# Altium footprint library hphonglib.PcbLib: 703 footprints (part 41 of 44)
Each footprint in its own frame and in the unit in brackets; x right, y up, seen from the top. Pads: shape width x height; smd on the part's side, far side on the other; paste and mask are expansions set on the pad; w line width, h text height; cw(c..) or ccw(c..) is an arc to the next point about the centre after c.
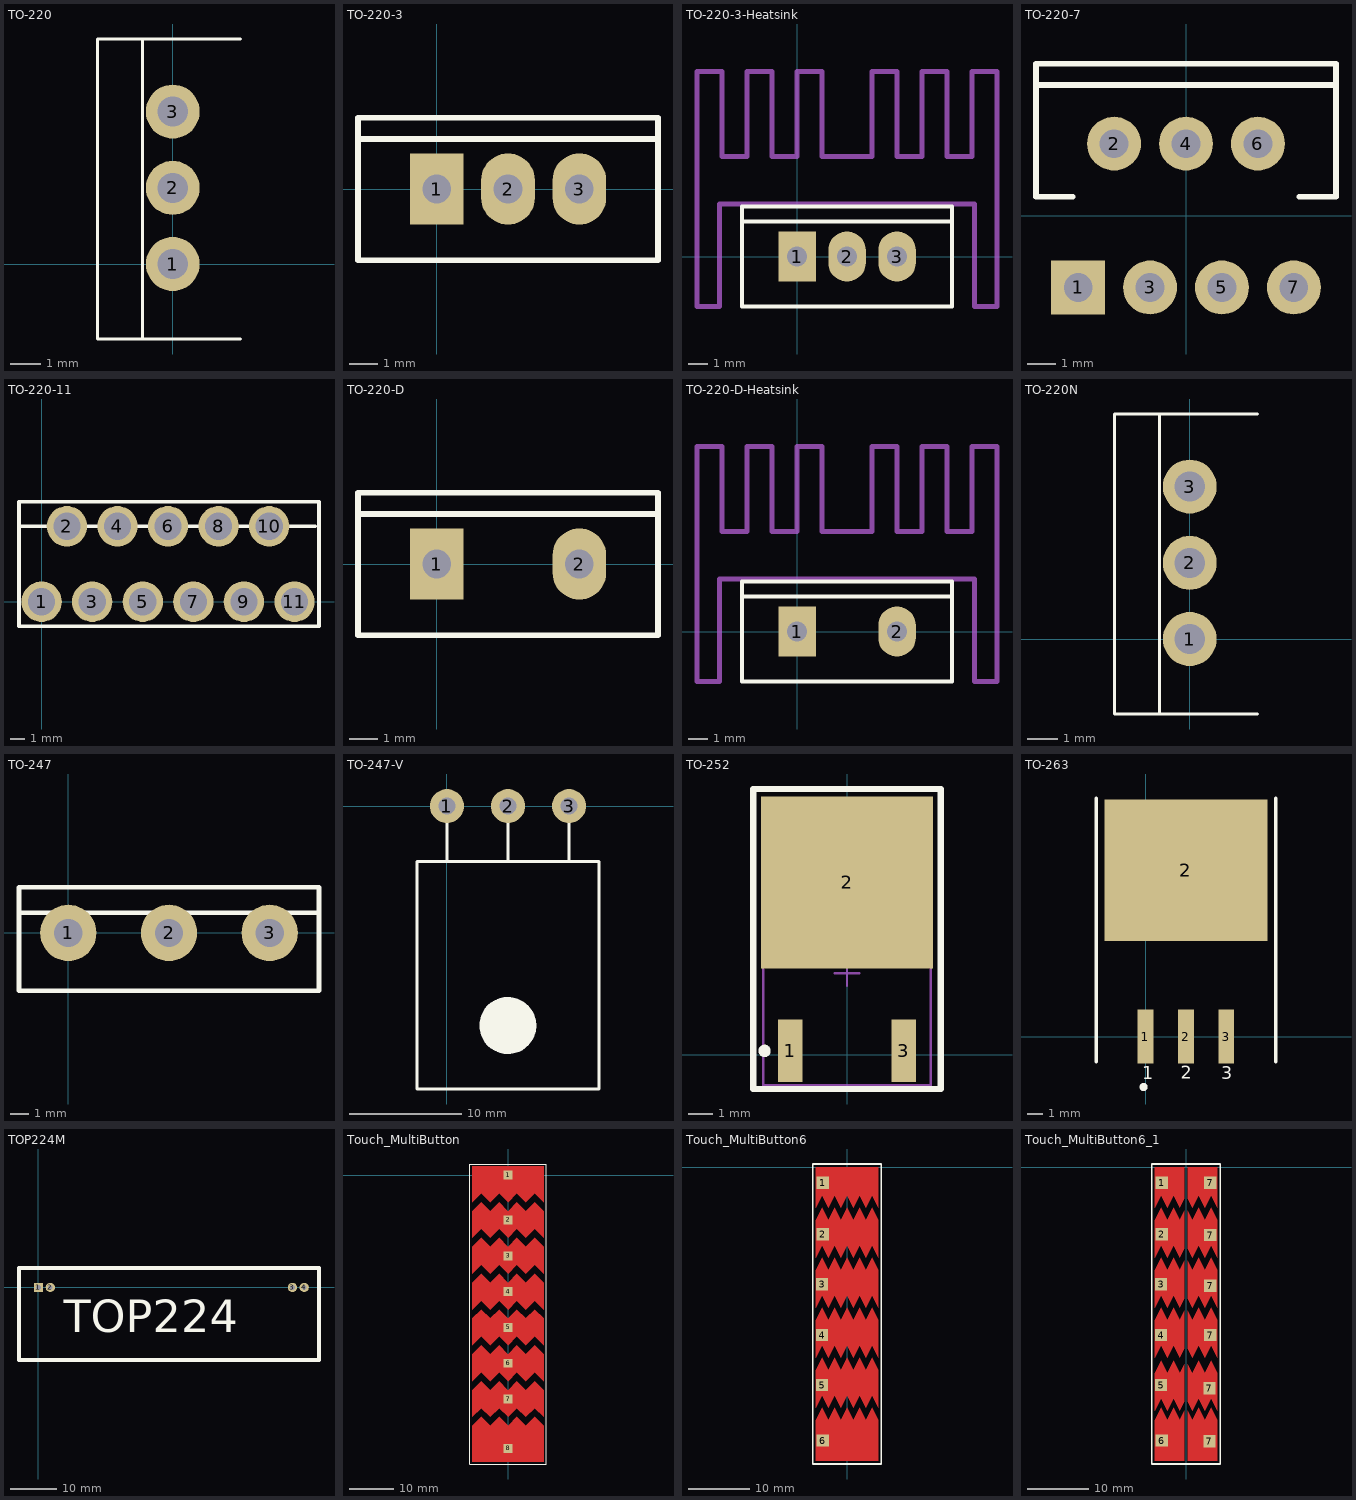
[diagram p40: the footprints below, top view; thin cyan lines are the x and y axes]

## TO-220 [mm]
pads (3):
  round 1.8 hole 1: 1(0,0) 2(0,2.54) 3(0,5.08)
Top Overlay:
  lines w0.1: -1,-2.5 -1,7.5 ; 2.25,-2.5 -2.5,-2.5 -2.5,7.5 2.25,7.5
Bottom Overlay:
  lines w0.1: -1.725,-1.4 -1.725,6.5 1.625,6.5 1.625,-1.4 -1.725,-1.4
Mechanical 13:
  text ".Designator" at 0.635,0.457 h2.03
3D body: height 16.7, standoff 13, extent -2.4,-2.45 -1.1,7.45
3D body: height 13, standoff 4, extent -2.4,-2.45 2.1,7.45
3D body: height 4, standoff 1, extent -0.3,-0.65 0.2,0.65
3D body: height 1, standoff -9, extent -0.3,-0.4 0.2,0.4
3D body: height 18.4, standoff 16.7, extent -2.4,-1.85 -1.1,6.85
3D body: height 19.7, standoff 18.4, extent -2.4,-2.45 -1.1,7.45
3D body: height 1, standoff -9, extent -0.3,2.14 0.2,2.94
3D body: height 1, standoff -9, extent -0.3,4.68 0.2,5.48
3D body: height 4, standoff 1, extent -0.3,1.89 0.2,3.19
3D body: height 4, standoff 1, extent -0.3,4.43 0.2,5.73

## TO-220-3 [mil] "TO-220; 3 Leads; Solder Pad 35mil"
pads (3):
  rect 75x100 hole 40: 1(0,0)
  oval 75x100 hole 40: 2(100,0) 3(200,0)
Top Overlay:
  lines w7.87: -110,70 310,70 ; -110,-100 310,-100 310,100 -110,100 -110,-100
3D body: height 760.24, standoff -372.83, extent -94.88,-83.16 294.88,94

## TO-220-3-Heatsink [mil] "TO-220; Heatsink; 3 Leads; Solder Pad 35mil"
pads (3):
  rect 75x100 hole 40: 1(0,0)
  oval 75x100 hole 40: 2(100,0) 3(200,0)
Top Overlay:
  lines w7.87: -110,70 310,70 ; -110,-100 -110,100 310,100 310,-100 -110,-100
Mechanical 1:
  lines w10: -200,-100 -200,370 ; 400,-100 400,370
Mechanical 13:
  lines w10: -200,-100 -155,-100 -155,105 355,105 355,-100 400,-100 ; -200,370 -150,370 -150,200 -100,200 -100,370 -50,370 -50,200 0,200 0,370 50,370 50,200 150,200 150,370 200,370 200,200 250,200 250,370 300,370 300,200 350,200 350,370 400,370
3D body: height 985.25, standoff -148.61, extent -191,-76.63 390.94,348.62
3D body: height 810.24, standoff -322.83, extent -94.88,-83.16 294.88,94

## TO-220-7 [mil] "TO-220; 7 Bent Staggered Leads; Solder Pad 35mil"
height 830.71
pads (7):
  rect 75x75 hole 40: 1(-150,-100)
  round 75 hole 40: 2(-100,100) 3(-50,-100) 4(0,100) 5(50,-100) 6(100,100) 7(150,-100)
Top Overlay:
  lines w7.87: -208.66,181.73 208.66,181.73 ; -157.48,26.38 -208.66,26.38 -208.66,211.42 208.66,211.42 208.66,26.38 157.48,26.38
3D body: height 766.77, standoff -67.87, extent -200.57,-110.03 201,212.02

## TO-220-11 [mil] "TO-220; 11 Bent Staggered Leads; Solder Pad 35mil"
pads (11):
  round 107 hole 72: 1(0,0) 2(67,200) 3(134,0) 4(201,200) 5(268,0) 6(335,200) 7(402,0) 8(469,200) 9(536,0) 10(603,200) 11(670,0)
Top Overlay:
  lines w10: -55,200 725,200 ; -60,-65 -60,265 735,265 735,-65 -60,-65

## TO-220-D [mil] "TO-220; Diode; 2 Leads; Solder Pad 35mil"
pads (2):
  rect 75x100 hole 40: 1(0,0)
  oval 75x100 hole 40: 2(200,0)
Top Overlay:
  lines w7.87: -110,70 310,70 ; -110,-100 310,-100 310,100 -110,100 -110,-100
3D body: height 740.24, standoff -392.83, extent -94.88,-83.16 294.89,94

## TO-220-D-Heatsink [mil] "TO-220; Diode; Heatsink; 2 Leads; Solder Pad 35mil"
pads (2):
  rect 75x100 hole 40: 1(0,0)
  oval 75x100 hole 40: 2(200,0)
Top Overlay:
  lines w7.87: -110,70 310,70 ; -110,-100 310,-100 310,100 -110,100 -110,-100
Mechanical 1:
  lines w10: -200,-100 -200,370 ; 400,-100 400,370
Mechanical 13:
  lines w10: -200,-100 -155,-100 -155,105 355,105 355,-100 400,-100 ; -200,370 -150,370 -150,200 -100,200 -100,370 -50,370 -50,200 0,200 0,370 50,370 50,200 150,200 150,370 200,370 200,200 250,200 250,370 300,370 300,200 350,200 350,370 400,370
3D body: height 810.24, standoff -322.83, extent -94.88,-83.16 294.88,94
3D body: height 985.25, standoff -148.61, extent -191,-76.63 390.94,348.62

## TO-220N [mm]
pads (3):
  round 1.8 hole 1: 1(0,0) 2(0,2.54) 3(0,5.08)
Top Overlay:
  lines w0.1: -1,-2.5 -1,7.5 ; 2.25,-2.5 -2.5,-2.5 -2.5,7.5 2.25,7.5
Bottom Overlay:
  lines w0.1: -1.725,-1.4 1.625,-1.4 1.625,6.5 -1.725,6.5 -1.725,-1.4
3D body: height 18, standoff -10.4, extent -2.62,-2.667 1.88,7.733

## TO-247 [mil] "TO-247; 3 Leads; Solder Pad 60mil"
pads (3):
  round 120 hole 60: 1(0,0) 2(214.5,0) 3(429,0)
Top Overlay:
  lines w10: -105,43 534,43 ; -105,-123 534,-123 534,97 -105,97 -105,-123
3D body: height 1037.4, standoff -320.87, extent -92.5,-117.33 521.67,91.33

## TO-247-V [mil] "TO-247; Vertical; 3 Leads; Solder Pad 60mil"
pads (3):
  round 120 hole 60: 1(0,0) 2(214.5,0) 3(429,0)
Top Overlay:
  circle w100: c214,-771 r50
  lines w10: 0,-194 0,0 ; 214.5,-195 214.5,0 ; 429,-195 429,0 ; -105,-994 534,-994 534,-195 -105,-195 -105,-994
3D body: height 228.74, standoff -239.76, extent -90.62,-988 519.62,12

## TO-252 [mm]
pads (3):
  rect 1x2.54 smd: 1(-2.3,0.152) 3(2.3,0.152)
  rect 7x7 smd: 2(0,7)
Top Overlay:
  circle w0.25: c-3.35,0.152 r0.125
  lines w0.254: -3.81,-1.397 3.81,-1.397 3.81,10.795 0.508,10.795 -3.81,10.795 -3.81,-1.397
Mechanical 13:
  text ".Designator" at 2.692,3.912 h2.03
Mechanical 15:
  lines w0.1: -0.5,3.302 0.5,3.302 ; 0,2.802 0,3.802 ; -3.4,-1.248 -3.4,7.852 3.4,7.852 3.4,-1.248 -3.4,-1.248

## TO-263 [mm]
pads (4):
  rect 1x3.4 smd: 1(-0.006,0.009) 2(2.534,0.009) 3(5.074,0.009)
  rect 10.25x8.9 smd: 2(2.534,10.459)
Top Overlay:
  circle w0.25: c-0.126,-3.166 r0.125
  lines w0.2: -3.106,-1.591 -3.106,15.009 ; 8.194,-1.591 8.194,15.009
  text "2" at 2.213,-2.653 h0.8
  text "3" at 4.774,-2.691 h0.8
  text "1" at -0.201,-2.666 h0.8
Mechanical 13:
  text ".Designator" at -1.422,4.521 h2.03
3D body: height 2.9, standoff 0, extent 4.694,0.75 5.456,1.25
3D body: height 2.9, standoff 0, extent -0.381,0.76 0.381,1.26
3D body: height 0.5, standoff 0, extent 4.694,-1.153 5.456,1
3D body: height 2.9, standoff 2.4, extent 4.475,1 5.675,3.8
3D body: height 2.9, standoff 2.4, extent 1.94,2.375 3.14,3.81
3D body: height 2.9, standoff 2.4, extent -0.6,1.01 0.6,3.81
3D body: height 1.3, standoff 0, extent -2.46,13.01 7.54,14.21
3D body: height 4.5, standoff 0, extent -2.46,3.81 7.54,13.01
3D body: height 0.5, standoff 0, extent -0.381,-1.143 0.381,1.01

## TOP224M [mm] "module TOP224"
pads (4):
  rect 2x2 hole 1: 1(0,0)
  round 2 hole 1: 2(2.54,0) 3(54.61,0) 4(57.15,0)
Top Overlay:
  lines w0.8: -4.191,-15.621 -4.191,4.191 60.325,4.191 60.325,-15.621 -4.191,-15.621
  text "TOP224" at 5.461,-9.652 h7

## Touch_MultiButton [mm]
pads (8):
  rect 2x2 smd paste+0 mask+0: 1(0,0) 2(0,-10) 3(0,-18) 4(0,-26) 5(0,-34) 6(0,-42) 7(0,-50) 8(0,-61)
Top Layer:
  region: 8,-40 6,-38 4,-40 2,-38 0,-40 -2,-38 -4,-40 -6,-38 -8,-40 -8,-46 -6,-44 -4,-46 -2,-44 0,-46 2,-44 4,-46 6,-44 8,-46
  region: 8,-48 6,-46 4,-48 2,-46 0,-48 -2,-46 -4,-48 -6,-46 -8,-48 -8,-54 -6,-52 -4,-54 -2,-52 0,-54 2,-52 4,-54 6,-52 8,-54
  region: 8,-32 6,-30 4,-32 2,-30 0,-32 -2,-30 -4,-32 -6,-30 -8,-32 -8,-38 -6,-36 -4,-38 -2,-36 0,-38 2,-36 4,-38 6,-36 8,-38
  region: 8,-24 6,-22 4,-24 2,-22 0,-24 -2,-22 -4,-24 -6,-22 -8,-24 -8,-30 -6,-28 -4,-30 -2,-28 0,-30 2,-28 4,-30 6,-28 8,-30
  region: -8,-64 -8,-56 -7,-55 -6,-54 -4,-56 -2,-54 0,-56 2,-54 4,-56 6,-54 7,-55 8,-56 8,-64
  region: 8,-16 6,-14 4,-16 2,-14 0,-16 -2,-14 -4,-16 -6,-14 -8,-16 -8,-22 -6,-20 -4,-22 -2,-20 0,-22 2,-20 4,-22 6,-20 8,-22
  region: 8,-8 6,-6 4,-8 2,-6 0,-8 -2,-6 -4,-8 -6,-6 -8,-8 -8,-14 -6,-12 -4,-14 -2,-12 0,-14 2,-12 4,-14 6,-12 8,-14
  region: 8,2 8,-6 7,-5 6,-4 4,-6 3,-5 2,-4 0,-6 -2,-4 -3,-5 -4,-6 -6,-4 -7,-5 -8,-6 -8,2
Top Overlay:
  lines w0.254: -8.5,-64.5 8.5,-64.5 8.5,2.5 -8.5,2.5 -8.5,-64.5

## Touch_MultiButton6 [mm]
pads (6):
  rect 2x2 smd paste+0 mask+0: 1(-3.937,-2.54) 2(-3.937,-10.922) 3(-4.064,-19.05) 4(-4.064,-27.305) 5(-4.064,-35.433) 6(-3.937,-44.45)
Top Layer:
  region: 5.08,0 5.08,-6.604 4.064,-4.572 3.048,-6.604 2.032,-4.572 1.016,-6.604 0,-4.572 -1.016,-6.604 -2.032,-4.572 -3.048,-6.604 -4.064,-4.572 -5.08,-6.604 -5.08,0
  region: 5.08,-8.636 4.064,-6.604 3.048,-8.636 2.032,-6.604 1.016,-8.636 0,-6.604 -1.016,-8.636 -2.032,-6.604 -3.048,-8.636 -4.064,-6.604 -5.08,-8.636 -5.08,-14.732 -4.064,-12.7 -3.048,-14.732 -2.032,-12.7 -1.016,-14.732 0,-12.7 1.016,-14.732 2.032,-12.7 3.048,-14.732 4.064,-12.7 5.08,-14.732
  region: 5.08,-16.764 4.064,-14.732 3.048,-16.764 2.032,-14.732 1.016,-16.764 0,-14.732 -1.016,-16.764 -2.032,-14.732 -3.048,-16.764 -4.064,-14.732 -5.08,-16.764 -5.08,-22.86 -4.064,-20.828 -3.048,-22.86 -2.032,-20.828 -1.016,-22.86 0,-20.828 1.016,-22.86 2.032,-20.828 3.048,-22.86 4.064,-20.828 5.08,-22.86
  region: 5.08,-24.892 4.064,-22.86 3.048,-24.892 2.032,-22.86 1.016,-24.892 0,-22.86 -1.016,-24.892 -2.032,-22.86 -3.048,-24.892 -4.064,-22.86 -5.08,-24.892 -5.08,-30.988 -4.064,-28.956 -3.048,-30.988 -2.032,-28.956 -1.016,-30.988 0,-28.956 1.016,-30.988 2.032,-28.956 3.048,-30.988 4.064,-28.956 5.08,-30.988
  region: 5.08,-33.02 4.064,-30.988 3.048,-33.02 2.032,-30.988 1.016,-33.02 0,-30.988 -1.016,-33.02 -2.032,-30.988 -3.048,-33.02 -4.064,-30.988 -5.08,-33.02 -5.08,-39.116 -4.064,-37.084 -3.048,-39.116 -2.032,-37.084 -1.016,-39.116 0,-37.084 1.016,-39.116 2.032,-37.084 3.048,-39.116 4.064,-37.084 5.08,-39.116
  region: -5.08,-47.752 -5.08,-41.148 -4.064,-39.116 -3.048,-41.148 -2.032,-39.116 -1.016,-41.148 0,-39.116 1.016,-41.148 2.032,-39.116 3.048,-41.148 4.064,-39.116 5.08,-41.148 5.08,-47.752
Top Overlay:
  lines w0.254: -5.588,-48.26 5.588,-48.26 5.588,0.508 -5.588,0.508 -5.588,-48.26

## Touch_MultiButton6_1 [mm]
pads (12):
  rect 2x2 smd paste+0 mask+0: 1(-3.937,-2.54) 2(-3.937,-10.922) 3(-4.064,-19.05) 4(-4.064,-27.305) 5(-4.064,-35.433) 6(-3.937,-44.45) 7(3.81,-44.577) 7(3.81,-35.941) 7(3.937,-27.305) 7(3.937,-19.304) 7(3.937,-11.049) 7(3.937,-2.54)
Top Layer:
  region: 0.254,-47.752 0.254,-39.624 1.016,-41.148 2.032,-39.116 3.048,-41.148 4.064,-39.116 5.08,-41.148 5.08,-47.752
  region: -0.254,-32.004 -1.016,-33.528 -2.032,-31.496 -3.048,-33.528 -4.064,-31.496 -5.08,-33.528 -5.08,-39.624 -4.064,-37.592 -3.048,-39.624 -2.032,-37.592 -1.016,-39.624 -0.254,-38.1
  region: 5.08,-33.528 4.064,-31.496 3.048,-33.528 2.032,-31.496 1.016,-33.528 0.254,-32.004 0.254,-38.1 1.016,-39.624 2.032,-37.592 3.048,-39.624 4.064,-37.592 5.08,-39.624
  region: -0.254,-23.368 -1.016,-24.892 -2.032,-22.86 -3.048,-24.892 -4.064,-22.86 -5.08,-24.892 -5.08,-30.988 -4.064,-28.956 -3.048,-30.988 -2.032,-28.956 -1.016,-30.988 -0.254,-29.464
  region: 5.08,-24.892 4.064,-22.86 3.048,-24.892 2.032,-22.86 1.016,-24.892 0.254,-23.368 0.254,-29.464 1.016,-30.988 2.032,-28.956 3.048,-30.988 4.064,-28.956 5.08,-30.988
  region: -0.254,-15.24 -1.016,-16.764 -2.032,-14.732 -3.048,-16.764 -4.064,-14.732 -5.08,-16.764 -5.08,-22.86 -4.064,-20.828 -3.048,-22.86 -2.032,-20.828 -1.016,-22.86 -0.254,-21.336
  region: 5.08,-16.764 4.064,-14.732 3.048,-16.764 2.032,-14.732 1.016,-16.764 0.254,-15.24 0.254,-21.336 1.016,-22.86 2.032,-20.828 3.048,-22.86 4.064,-20.828 5.08,-22.86
  region: 5.08,-8.636 4.064,-6.604 3.048,-8.636 2.032,-6.604 1.016,-8.636 0.254,-7.112 0.254,-13.208 1.016,-14.732 2.032,-12.7 3.048,-14.732 4.064,-12.7 5.08,-14.732
  region: 5.08,0 5.08,-6.604 4.064,-4.572 3.048,-6.604 2.032,-4.572 1.016,-6.604 0.254,-5.08 0.254,0
  region: -5.08,-47.752 -5.08,-41.148 -4.064,-39.116 -3.048,-41.148 -2.032,-39.116 -1.016,-41.148 -0.254,-39.624 -0.254,-47.752
  region: -0.254,-7.112 -1.016,-8.636 -2.032,-6.604 -3.048,-8.636 -4.064,-6.604 -5.08,-8.636 -5.08,-14.732 -4.064,-12.7 -3.048,-14.732 -2.032,-12.7 -1.016,-14.732 -0.254,-13.208
  region: -0.254,0 -0.254,-5.08 -1.016,-6.604 -2.032,-4.572 -3.048,-6.604 -4.064,-4.572 -5.08,-6.604 -5.08,0
Top Overlay:
  lines w0.254: -5.588,-48.26 -5.588,0.508 5.588,0.508 5.588,-48.26 -5.588,-48.26